# Altium footprint library JL_PCB.PCBLIB: 1129 footprints (part 11 of 72)
Each footprint in its own frame and in the unit in brackets; x right, y up, seen from the top. Pads: shape width x height; smd on the part's side, far side on the other; paste and mask are expansions set on the pad; w line width, h text height; cw(c..) or ccw(c..) is an arc to the next point about the centre after c.
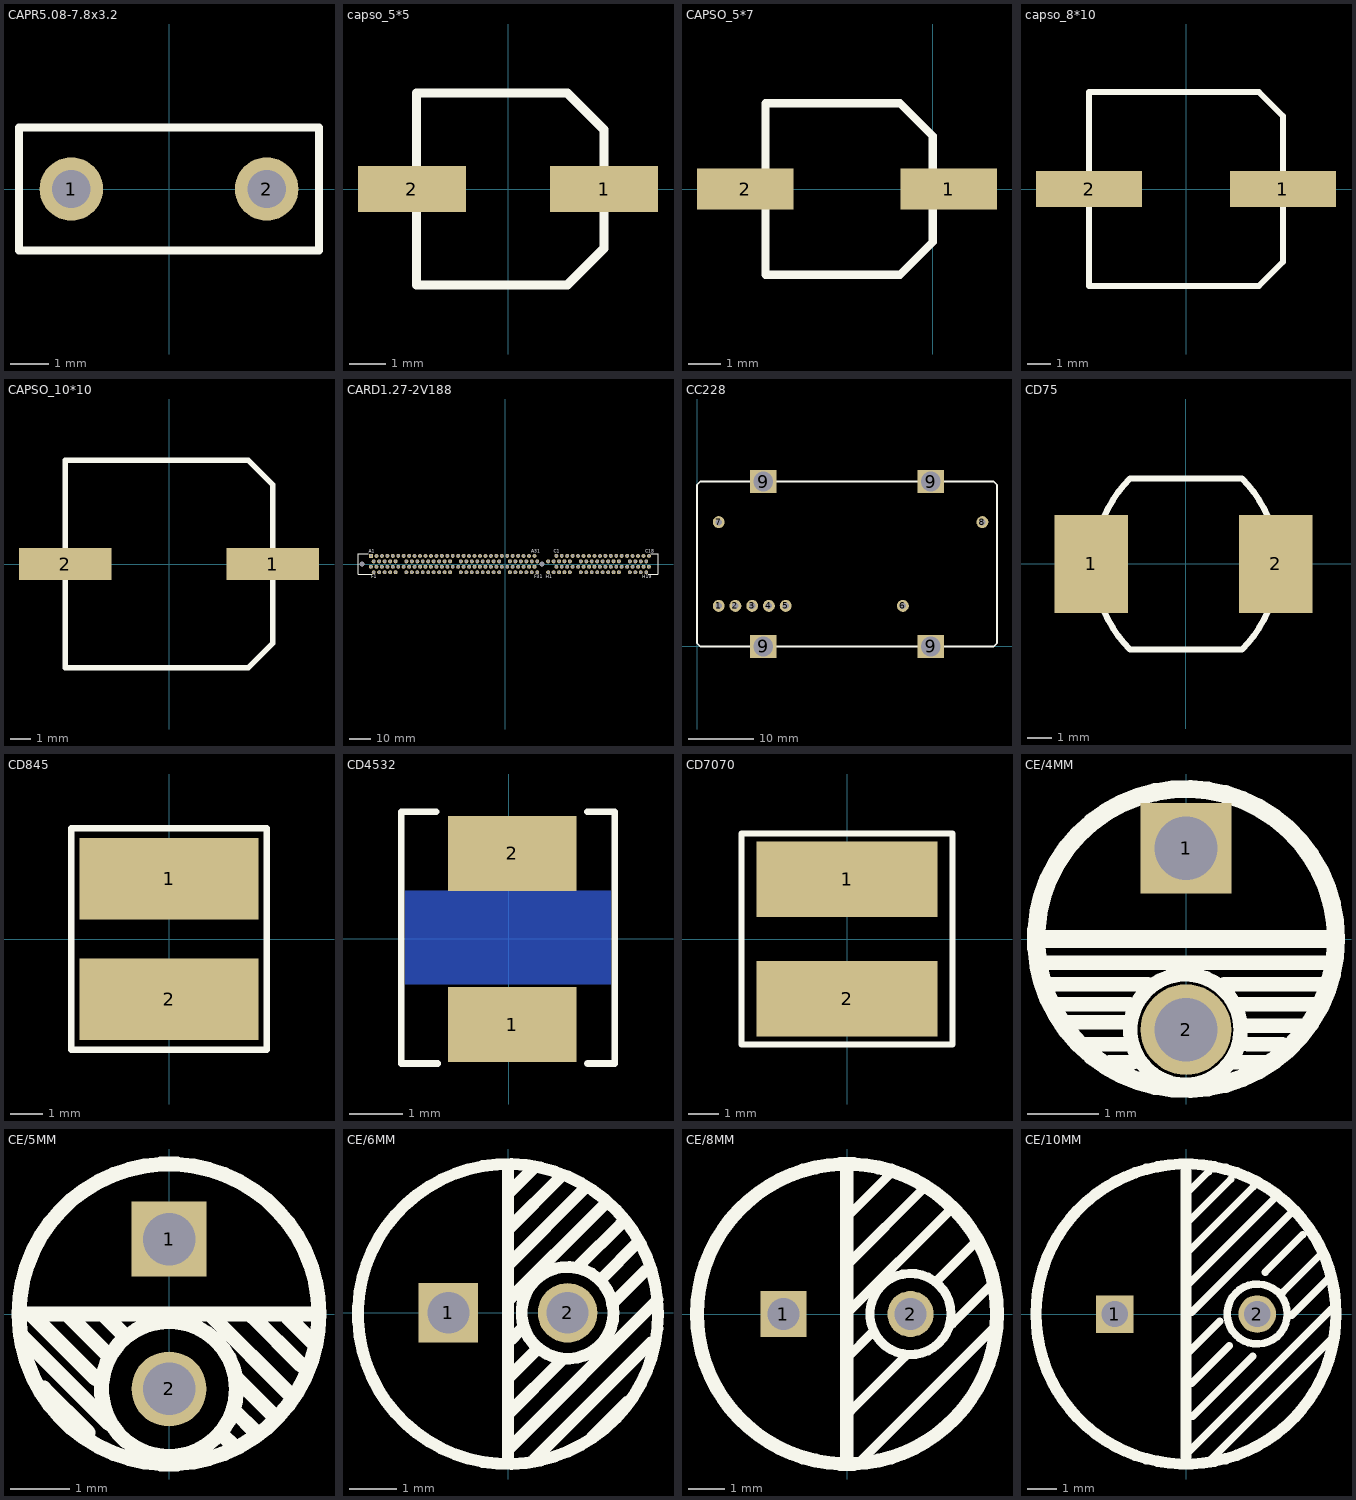
[diagram p10: the footprints below, top view; thin cyan lines are the x and y axes]

## CAPR5.08-7.8x3.2 [mm] "Capacitor, Ceramic, Thru-Hole, Dipped Radial; Body 7.8 x 3.2 mm (WxT) Pin Spacing 5.08 mm (typ)"
height 6
pads (2):
  round 1.65 hole 1: 1(-2.54,0) 2(2.54,0)
TopOverlay:
  lines w0.2: -3.9,-1.6 3.9,-1.6 3.9,1.6 -3.9,1.6 -3.9,-1.6

## capso_5*5 [mil]
pads (2):
  rect 118.11x50.16 smd: 1(105,0) 2(-105,0)
TopOverlay:
  lines w10: -100,-105 -100,105 65,105 105,65 105,-65 65,-105 -100,-105
3D body "User Library-ALU-C.STEP": height 212.99, standoff 0, extent -113.14,-101 119.14,107.66

## CAPSO_5*7 [mm]
pads (2):
  rect 3x1.274 smd: 1(0.5,0) 2(-5.834,0)
TopOverlay:
  lines w0.254: -5.207,-2.667 -5.207,2.667 -1.016,2.667 0,1.651 0,-1.651 -1.016,-2.667 -5.207,-2.667
3D body "User Library-ALU-C.STEP": height 5.41, standoff 0, extent -5.541,-2.667 0.359,2.633

## capso_8*10 [mil]
pads (2):
  rect 175x60 smd: 1(160,0) 2(-160,0)
TopOverlay:
  lines w10: -160,-160 120,-160 160,-120 160,120 120,160 -160,160 -160,-160
3D body "User Library-ALU-F.STEP": height 401.57, standoff 0, extent -191.88,-162.38 197.89,164.39

## CAPSO_10*10 [mil]
pads (2):
  rect 175x60 smd: 1(196.85,0) 2(-196.85,0)
TopOverlay:
  lines w10: -196.85,-196.85 150,-196.85 196.85,-150 196.85,150 150,196.85 -196.85,196.85 -196.85,-196.85
3D body "User Library-ALU-G.STEP": height 401.57, standoff 0, extent -227.34,-205.75 229.35,199.76

## CARD1.27-2V188 [mm] "Connector; EISA, Thru-Hole; 188 Position; Vertical; Pitch 1.27 mm"
height 15.49
pads (190):
  rect 1.85x1.85 hole 1.1: A1(-62.685,3.81)
  round 1.85 hole 1.1: A2(-60.145,3.81) A3(-57.605,3.81) A4(-55.065,3.81) A5(-52.525,3.81) A6(-49.985,3.81) A7(-47.445,3.81) A8(-44.905,3.81) A9(-42.365,3.81) A10(-39.825,3.81) A11(-37.285,3.81) A12(-34.745,3.81) A13(-32.205,3.81) A14(-29.665,3.81) A15(-27.125,3.81) A16(-24.585,3.81) A17(-22.045,3.81) A18(-19.505,3.81) A19(-16.965,3.81) A20(-14.425,3.81) A21(-11.885,3.81) A22(-9.345,3.81) A23(-6.805,3.81) A24(-4.265,3.81) A25(-1.725,3.81) A26(0.815,3.81) A27(3.355,3.81) A28(5.895,3.81) A29(8.435,3.81) A30(10.975,3.81) A31(13.515,3.81) B1(-62.685,-1.27) B2(-60.145,-1.27) B3(-57.605,-1.27) B4(-55.065,-1.27) B5(-52.525,-1.27) B6(-49.985,-1.27) B7(-47.445,-1.27) B8(-44.905,-1.27) B9(-42.365,-1.27) B10(-39.825,-1.27) B11(-37.285,-1.27) B12(-34.745,-1.27) B13(-32.205,-1.27) B14(-29.665,-1.27) B15(-27.125,-1.27) B16(-24.585,-1.27) B17(-22.045,-1.27) B18(-19.505,-1.27) B19(-16.965,-1.27) B20(-14.425,-1.27) B21(-11.885,-1.27) B22(-9.345,-1.27) B23(-6.805,-1.27) B24(-4.265,-1.27) B25(-1.725,-1.27) B26(0.815,-1.27) B27(3.355,-1.27) B28(5.895,-1.27) B29(8.435,-1.27) B30(10.975,-1.27) B31(13.515,-1.27) C1(23.675,3.81) C2(26.215,3.81) C3(28.755,3.81) C4(31.295,3.81) C5(33.835,3.81) C6(36.375,3.81) C7(38.915,3.81) C8(41.455,3.81) C9(43.995,3.81) C10(46.535,3.81) C11(49.075,3.81) C12(51.615,3.81) C13(54.155,3.81) C14(56.695,3.81) C15(59.235,3.81) C16(61.775,3.81) C17(64.315,3.81) C18(66.855,3.81) D1(23.675,-1.27) D2(26.215,-1.27) D3(28.755,-1.27) D4(31.295,-1.27) D5(33.835,-1.27) D6(36.375,-1.27) D7(38.915,-1.27) D8(41.455,-1.27) D9(43.995,-1.27) D10(46.535,-1.27) D11(49.075,-1.27) D12(51.615,-1.27) D13(54.155,-1.27) D14(56.695,-1.27) D15(59.235,-1.27) D16(61.775,-1.27) D17(64.315,-1.27) D18(66.855,-1.27) E1(-61.415,1.27) E2(-58.875,1.27) E3(-56.335,1.27) E4(-53.795,1.27) E5(-51.255,1.27) E7(-46.175,1.27) E8(-43.635,1.27) E9(-41.095,1.27) E10(-38.555,1.27) E11(-36.015,1.27) E12(-33.475,1.27) E13(-30.935,1.27) E14(-28.395,1.27) E15(-25.855,1.27) E17(-20.775,1.27) E18(-18.235,1.27) E19(-15.695,1.27) E20(-13.155,1.27) E21(-10.615,1.27) E22(-8.075,1.27) E23(-5.535,1.27) E24(-2.995,1.27) E26(2.085,1.27) E27(4.625,1.27) E28(7.165,1.27) E29(9.705,1.27) E30(12.245,1.27) E31(14.785,1.27) F1(-61.415,-3.81) F2(-58.875,-3.81) F3(-56.335,-3.81) F4(-53.795,-3.81) F5(-51.255,-3.81) F7(-46.175,-3.81) F8(-43.635,-3.81) F9(-41.095,-3.81) F10(-38.555,-3.81) F11(-36.015,-3.81) F12(-33.475,-3.81) F13(-30.935,-3.81) F14(-28.395,-3.81) F15(-25.855,-3.81) F17(-20.775,-3.81) F18(-18.235,-3.81) F19(-15.695,-3.81) F20(-13.155,-3.81) F21(-10.615,-3.81) F22(-8.075,-3.81) F23(-5.535,-3.81) F24(-2.995,-3.81) F26(2.085,-3.81) F27(4.625,-3.81) F28(7.165,-3.81) F29(9.705,-3.81) F30(12.245,-3.81) F31(14.785,-3.81) G1(19.865,1.27) G2(22.405,1.27) G3(24.945,1.27) G4(27.485,1.27) G5(30.025,1.27) G7(35.105,1.27) G8(37.645,1.27) G9(40.185,1.27) G10(42.725,1.27) G11(45.265,1.27) G12(47.805,1.27) G13(50.345,1.27) G14(52.885,1.27) G16(57.965,1.27) G17(60.505,1.27) G18(63.045,1.27) G19(65.585,1.27) H1(19.865,-3.81) H2(22.405,-3.81) H3(24.945,-3.81) H4(27.485,-3.81) H5(30.025,-3.81) H7(35.105,-3.81) H8(37.645,-3.81) H9(40.185,-3.81) H10(42.725,-3.81) H11(45.265,-3.81) H12(47.805,-3.81) H13(50.345,-3.81) H14(52.885,-3.81) H16(57.965,-3.81) H17(60.505,-3.81) H18(63.045,-3.81) H19(65.585,-3.81)
  round 2.14 hole 2.45: MH1(-66.855,0) MH2(16.965,0)
TopOverlay:
  lines w0.2: -64.06,4.76 -68.735,4.76 -68.735,-4.76 -62.345,-4.76 ; 66.515,-4.76 71.065,-4.76 71.065,4.76 67.785,4.76
  text "A1" at -63.785,5.26 h1.5
  text "A31" at 12.015,5.26 h1.5
  text "F31" at 13.285,-6.71 h1.5
  text "F1" at -62.515,-6.71 h1.5
  text "H1" at 18.765,-6.71 h1.5
  text "C1" at 22.575,5.26 h1.5
  text "H19" at 63.835,-6.71 h1.5
  text "C18" at 65.105,5.26 h1.5

## CC228 [mm]
pads (12):
  round 1.8 hole 1: 1(3.29,6.15) 2(5.83,6.15) 3(8.37,6.15) 4(10.91,6.15) 5(13.45,6.15) 6(31.23,6.15) 7(3.29,18.85) 8(43.29,18.85)
  rect 4x3.5 hole 3: 9(10.05,0) 9(10.05,25) 9(35.45,0) 9(35.45,25)
TopOverlay:
  lines w0.254: 0,0.5 0,24.5 0.5,25 45,25 45.5,24.5 45.5,0.5 45,0 0.5,0 0,0.5

## CD75 [mm]
height 5
pads (2):
  rect 3x4 smd: 1(-3.886,0) 2(3.683,0)
TopOverlay:
  lines w0.254: -2.3,-3.5 cw(c1.2,0) -2.3,3.5 2.3,3.5 cw(c-1.2,0) 2.3,-3.5 -2.3,-3.5
3D body "User Library-SDR0805.step": height 5.07, standoff 0.02, extent -3.728,-3.725 3.626,3.775

## CD845 [mm]
pads (2):
  rect 5.5x2.5 smd: 1(0,1.85) 2(0,-1.85)
TopOverlay:
  lines w0.203: -3,-3.4 -3,3.4 3,3.4 3,-3.4 -3,-3.4
3D body "User Library-5845.STEP": height 4.5, standoff -0.05, extent -2.592,-2.893 2.592,2.893

## CD4532 [mm]
pads (2):
  rect 2.4x1.4 smd: 1(0.069,-1.605) 2(0.069,1.595)
BottomLayer:
  pour cut-out: 1.908,-0.854 1.908,0.894 -1.931,0.894 -1.931,-0.854
TopOverlay:
  lines w0.127: -1.358,2.371 -2.007,2.371 -2.007,-2.329 -1.323,-2.329 ; 1.47,-2.331 1.981,-2.331 1.981,2.369 1.47,2.369
3D body "User Library-4532-1.STEP": height 3.18, standoff -0.07, extent -2.006,-2.244 1.994,2.245

## CD7070 [mm]
pads (2):
  rect 6x2.5 smd: 1(0,1.981) 2(0,-1.981)
TopOverlay:
  lines w0.203: -3.505,-3.505 3.505,-3.505 3.505,3.505 -3.505,3.505 -3.505,-3.505
3D body "User Library-5845.STEP": height 4.5, standoff -0.05, extent -2.592,-2.893 2.592,2.893

## CE/4MM [mil]
pads (2):
  rect 50x50 / inner round 50 / far side rect 50x50 hole 35: 1(0,50)
  round 50 hole 35: 2(0,-50)
TopOverlay:
  circle w10: c0,0 r82.77
  circle w8: c-0.29,-50 r30.45
  lines w8: -79,-13 77,-13 ; -76,-25 -21,-25 ; -73,-36 -31,-36 ; -65,-46 -33,-46 ; -55,-58 -33,-58 ; -42,-68 -29,-68 ; 21,-25 75,-25 ; 27,-68 43,-68 ; 30,-36 72,-36 ; 33,-48 63,-48 ; 34,-58 53,-58
  lines w10: -78.74,0 78.74,0

## CE/5MM [mil]
pads (2):
  rect 50x50 / inner round 50 / far side rect 50x50 hole 35: 1(0,50)
  round 50 hole 35: 2(0,-50)
TopOverlay:
  circle w10: c0,-50 r45
  circle w10: c0,0 r100
  lines w10: -100,0 100,0 ; -99,-14 -40,-73 ; -91,-1 -49,-43 ; -83.5,-49.5 -54,-79 ; -67,-1 -42,-26 ; -44,0 -31,-13 ; 27.5,-0.5 81,-54 ; 35.5,-80.5 43,-88 ; 43.5,-64.5 58,-79 ; 45,-43 71,-69 ; 55.5,-1.5 88,-34 ; 79,-2 96,-19

## CE/6MM [mil]
pads (2):
  rect 50x50 / inner round 50 / far side rect 50x50 hole 35: 1(-50,0)
  round 50 hole 35: 2(50,0)
TopOverlay:
  circle w10: c0,-1 r126.02
  circle w10: c50,0 r38.6
  lines w10: 0,-126 0,120 ; 0,-115 125,10 ; 0,-85 45,-40 ; 0,-55 25,-30 ; 0,10 80,90 ; 0,40 65,105 ; 0,70 45,115 ; 0,100 20,120 ; 2.5,-22.5 10,-15 ; 22.5,-122.5 120,-25 ; 60,40 95,75 ; 70,-105 100,-75 ; 77.5,27.5 110,60 ; 87.5,7.5 115,35

## CE/8MM [mil]
pads (2):
  rect 50x50 / inner round 50 / far side rect 50x50 hole 35: 1(-69,0)
  round 50 hole 35: 2(69,0)
TopOverlay:
  circle w15: c0,0 r162.93
  circle w10: c69,0 r44.07
  lines w10: -0.01,1.01 114.51,115.53 ; 0.29,-47.4 27.54,-20.15 ; 0.58,53.78 84.36,137.56 ; 2.03,107.41 49,154.37 ; 4.06,-105.09 62.62,-46.53 ; 13.63,-161.04 162.64,-12.03 ; 97.41,35.8 141.19,79.58 ; 114.23,-10.58 160.9,36.09
  lines w15: -0.29,-161.04 -0.29,160.75
3D body "User Library-CapAluRadial_D80H115.STEP": height 511.81, standoff -118.11, extent -166.61,-170 166.61,163.61

## CE/10MM [mil]
pads (2):
  rect 50x50 / inner round 50 / far side rect 50x50 hole 35: 1(-95,0)
  round 50 hole 35: 2(95,0)
TopOverlay:
  circle w15: c0,0 r200
  circle w10: c95,0 r40
  lines w10: 0,-165 0,175 ; 0,80 90,170 ; 0,120 60,180 ; 0,160 30,190 ; 1.02,37.3 121.02,157.3 ; 3.96,-183.38 193.96,6.62 ; 5.14,-49.58 45.14,-9.58 ; 7.38,2.6 137.38,132.6 ; 7.61,-92.05 57.61,-42.05 ; 8.99,-136.19 88.99,-56.19 ; 27.55,-199.76 197.55,-29.76 ; 105.7,55.97 155.7,105.97 ; 130,30 180,80 ; 140.92,-1.48 190.92,48.52
  lines w15: 0,-190 0,190
3D body "User Library-CapAluRadial_D100H125.STEP": height 551.18, standoff -118.11, extent -205.81,-212.11 205.81,200